# Altium footprint library RFConnectors.PcbLib: 19 footprints (part 2 of 2)
Each footprint in its own frame and in the unit in brackets; x right, y up, seen from the top. Pads: shape width x height; smd on the part's side, far side on the other; paste and mask are expansions set on the pad; w line width, h text height; cw(c..) or ccw(c..) is an arc to the next point about the centre after c.
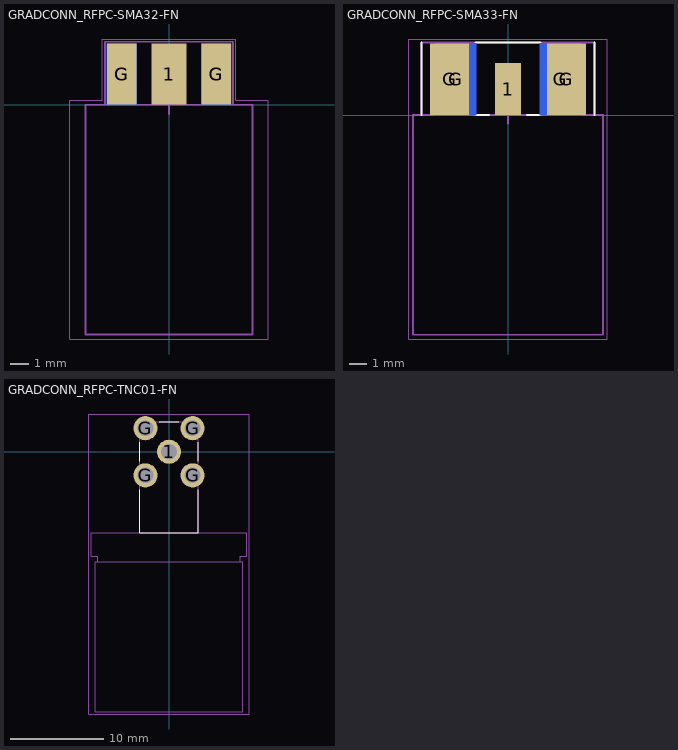
[diagram p1: the footprints below, top view; thin cyan lines are the x and y axes]

## GRADCONN_RFPC-SMA32-FN [mm]
height 9
pads (5):
  rect 1.87x3.3 smd mask+0.07: 1(0,1.65)
  rect 1.6x3.3 smd mask+0.07: G(-2.55,1.65) G(2.55,1.65)
  rect 1.6x3.3 smd far side mask+0.07: G(-2.55,1.65) G(2.55,1.65)
Top Assembly:
  lines w0.1: -3.45,0 -3.45,3.4 3.45,3.4 3.45,0 -3.45,0
  text ".Designator" at -1.578,1.542 h0.7
Top Courtyard:
  lines w0.05: -5.35,-12.65 5.35,-12.65 5.35,0.25 3.6,0.25 3.6,3.55 -3.6,3.55 -3.6,0.25 -5.35,0.25 -5.35,-12.65
  lines w0.1: -0.5,0 0.5,0 ; 0,-0.5 0,0.5
Assembly Notes:
  lines w0.1: -4.5,-12.4 4.5,-12.4 4.5,0 -4.5,0 -4.5,-12.4
3D body "RFPC-SMA32-FN-095-A_1.0.STEP": height 5.71, standoff -4.48, extent -5.096,-12.42 5.101,2.8

## GRADCONN_RFPC-SMA33-FN [mm]
height 11
pads (5):
  rect 1.5x3 smd mask+0.07: 1(0,1.5)
  rect 2.25x4.15 smd mask+0.07: G(-3.375,2.075) G(3.375,2.075)
  rect 2.35x4.15 smd far side mask+0.07: G(-3.025,2.075) G(3.025,2.075)
Top Overlay:
  lines w0.127: -5,0 -5,4.2 ; -1.887,0 -1.113,0 ; -1.887,4.2 1.887,4.2 ; 1.113,0 1.887,0 ; 5,0 5,4.2
Top Assembly:
  lines w0.1: -5,0 5,0 5,4.2 -5,4.2 -5,0
  text ".Designator" at -1.578,1.942 h0.7
Top Courtyard:
  lines w0.05: -5.75,-12.95 5.75,-12.95 5.75,4.4 -5.75,4.4 -5.75,-12.95
  lines w0.1: -0.5,0 0.5,0 ; 0,-0.5 0,0.5
Assembly Notes:
  lines w0.1: -5.5,-12.7 -5.5,0 5.5,0 5.5,-12.7 -5.5,-12.7
3D body "RFPC-SMA33-FN-095_rev1.0.STEP": height 5.98, standoff -5.02, extent -5.503,-12.6 5.497,4

## GRADCONN_RFPC-TNC01-FN [mm]
height 13.8
pads (5):
  round 2.6 hole 1.7 mask+0.07: 1(0,0) G(-2.54,-2.54) G(-2.54,2.54) G(2.54,-2.54) G(2.54,2.54)
Top Overlay:
  lines w0.127: -3.175,-4.078 -3.175,-8.71 3.175,-8.71 3.175,-4.078 ; -3.175,-1.002 -3.175,1.002 ; -1.026,3.23 1.026,3.23 ; 3.175,-1.002 3.175,1.002
Top Assembly:
  lines w0.1: -3.175,-8.71 3.175,-8.71 3.175,3.23 -3.175,3.23 -3.175,-8.71
  text ".Designator" at -1.578,-0.158 h0.7
Top Courtyard:
  lines w0.05: -8.65,-28.26 -8.65,4.07 8.65,4.07 8.65,-28.26 -8.65,-28.26
  lines w0.1: -0.5,0 0.5,0 ; 0,-0.5 0,0.5
Assembly Notes:
  lines w0.1: -7.7,-11.85 -7.7,-11.25 -8.4,-11.25 -8.4,-8.71 8.4,-8.71 8.4,-11.25 7.7,-11.25 7.7,-11.85 ; -7.7,-11.85 7.7,-11.85 ; -7.7,-11.85 -7.95,-11.85 -7.95,-28.01 7.95,-28.01 7.95,-11.85 7.7,-11.85
3D body "step_temp.STEP": height 13.23, standoff -3.57, extent -8.383,-28.005 8.417,3.235